# Altium footprint library MyPcbLib.PcbLib: 657 footprints (part 19 of 42)
Each footprint in its own frame and in the unit in brackets; x right, y up, seen from the top. Pads: shape width x height; smd on the part's side, far side on the other; paste and mask are expansions set on the pad; w line width, h text height; cw(c..) or ccw(c..) is an arc to the next point about the centre after c.
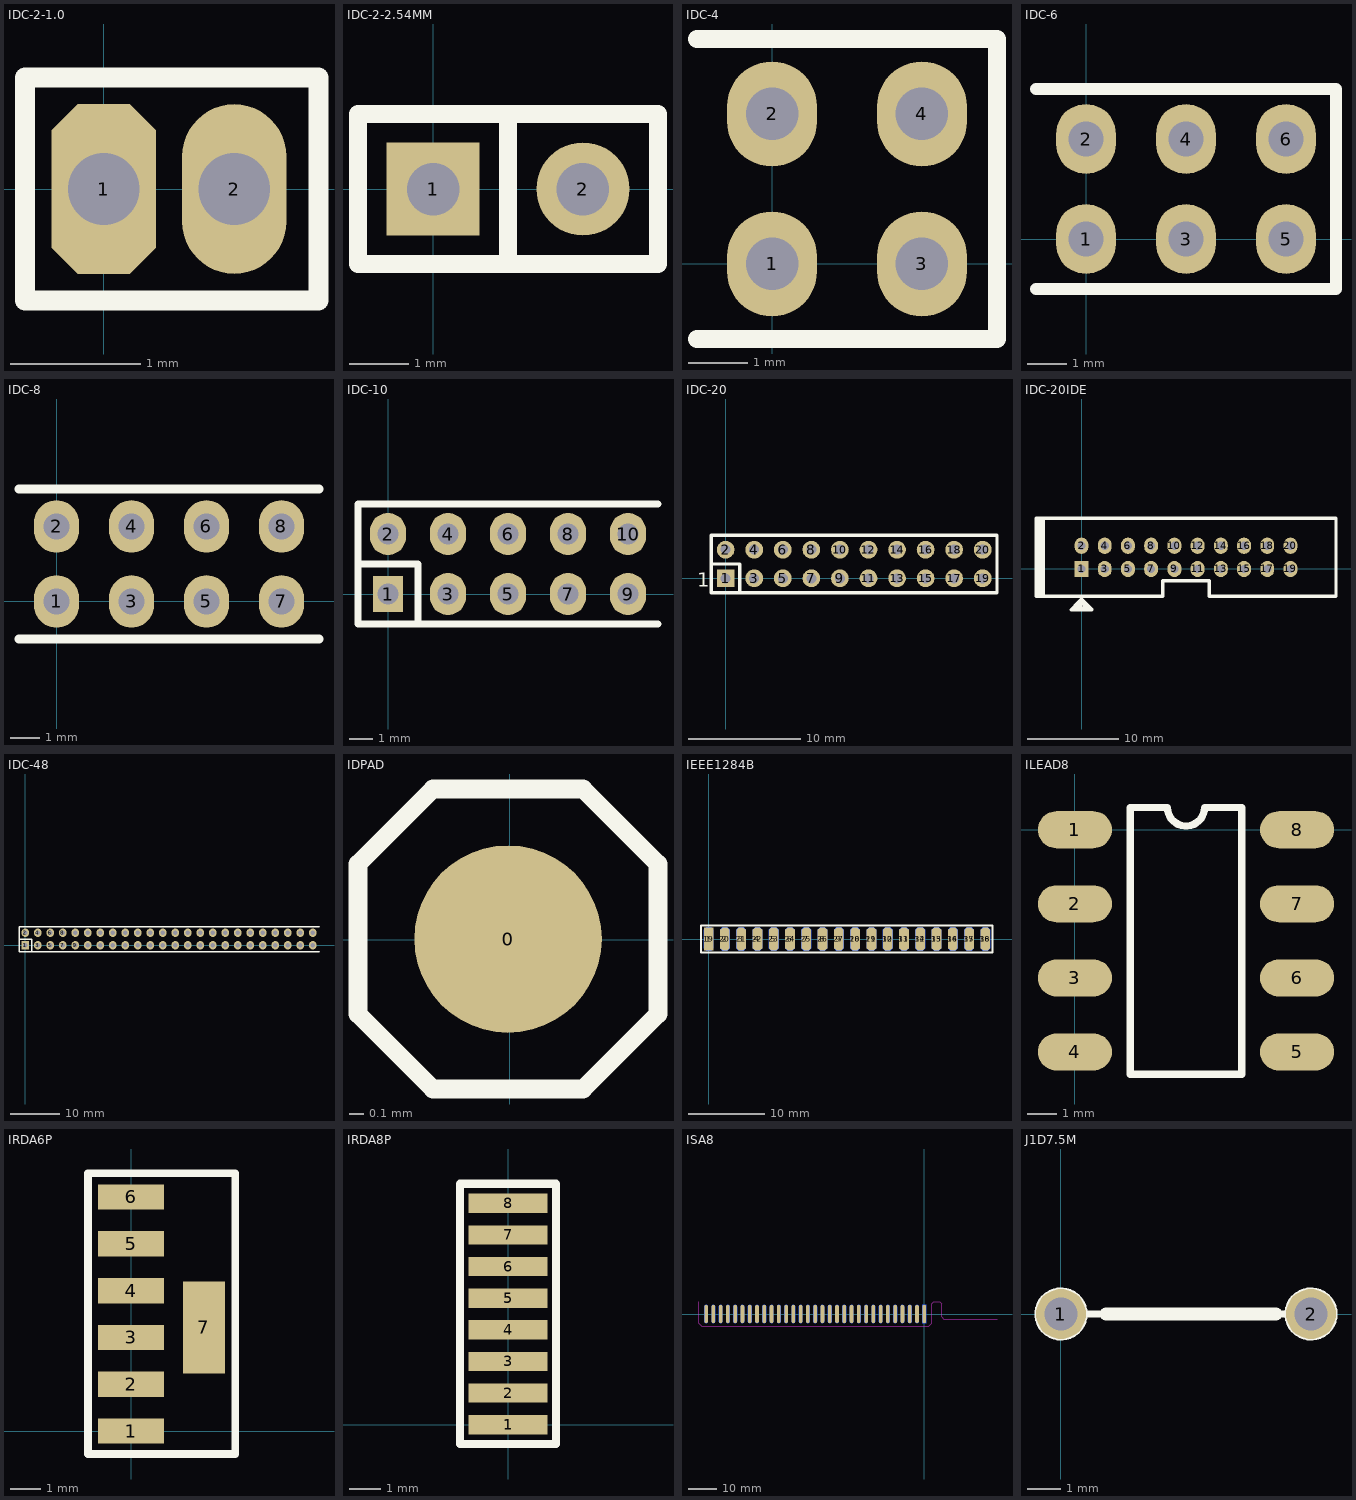
[diagram p18: the footprints below, top view; thin cyan lines are the x and y axes]

## IDC-2-1.0 [mm]
pads (2):
  oct 0.8x1.3 hole 0.55: 1(0,0)
  oval 0.8x1.3 hole 0.55: 2(1,0)
Top Overlay:
  lines w0.152: -0.603,-0.856 1.647,-0.856 1.647,0.856 -0.603,0.856 -0.603,-0.856

## IDC-2-2.54MM [mil]
pads (2):
  rect 62x62 hole 35: 1(0,0)
  round 62 hole 35: 2(100,0)
Top Overlay:
  lines w12: 50,-50 50,50 -50,50 ; -50,50 150,50 150,-50 -50,-50 -50,50

## IDC-4 [mil]
height 9.5
pads (4):
  oval 60x70 hole 35: 1(0,0) 2(0,100) 3(100,0) 4(100,100)
Top Overlay:
  lines w12: -50,-50 150,-50 150,150 -50,150

## IDC-6 [mil]
height 9.5
pads (6):
  oval 60x70 hole 35: 1(0,0) 2(0,100) 3(100,0) 4(100,100) 5(200,0) 6(200,100)
Top Overlay:
  lines w12: -50,-50 250,-50 250,150 -50,150

## IDC-8 [mil]
height 9.5
pads (8):
  oval 60x70 hole 35: 1(0,0) 2(0,100) 3(100,0) 4(100,100) 5(200,0) 6(200,100) 7(300,0) 8(300,100)
Top Overlay:
  lines w12: -50,-50 350,-50 ; -50,150 350,150

## IDC-10 [mil]
height 9.5
pads (10):
  rect 50x60 hole 35: 1(0,0)
  oval 60x70 hole 35: 2(0,100) 3(100,0) 4(100,100) 5(200,0) 6(200,100) 7(300,0) 8(300,100) 9(400,0) 10(400,100)
Top Overlay:
  lines w12: -50,50 50,50 50,-50 ; 450,-50 -50,-50 -50,150 450,150

## IDC-20 [mil]
pads (20):
  rect 62x62 hole 35: 1(0.5,-0.03)
  round 62 hole 35: 2(0.5,99.97) 3(100.5,-0.03) 4(100.5,99.97) 5(200.5,-0.03) 6(200.5,99.97) 7(300.5,-0.03) 8(300.5,99.97) 9(400.5,-0.03) 10(400.5,99.97) 11(500.5,-0.03) 12(500.5,99.97) 13(600.5,-0.03) 14(600.5,99.97) 15(700.5,-0.03) 16(700.5,99.97) 17(800.5,-0.03) 18(800.5,99.97) 19(900.5,-0.03) 20(900.5,99.97)
Top Overlay:
  lines w12: -49.5,49.97 50.5,49.97 50.5,-50.03 ; -49.5,-50.03 950.5,-50.03 950.5,149.97 -49.5,149.97 -49.5,-50.03
  text "1" at -99.89,-29.56 h50

## IDC-20IDE [mil]
pads (20):
  rect 60x70 hole 35: 1(0,0)
  oval 60x70 hole 35: 2(0,100) 3(100,0) 4(100,100) 5(200,0) 6(200,100) 7(300,0) 8(300,100) 9(400,0) 10(400,100) 11(500,0) 12(500,100) 13(600,0) 14(600,100) 15(700,0) 16(700,100) 17(800,0) 18(800,100) 19(900,0) 20(900,100)
Top Overlay:
  lines w8: 350,-118 350,-50 ; 550,-118 550,-50
  lines w15: -185,-118 -185,218 ; -175,-118 -175,218 ; -165,-118 -165,218 ; -34.24,-164.24 -30.76,-164.24 -20,-175 ; -27.15,-157.15 -22.85,-157.15 -5,-175 ; -16.42,-146.42 -16.42,-148.58 10,-175 ; -9.32,-139.32 -5.68,-139.32 30,-175 ; -196,-118 -196,218 1096,218 1096,-118 550,-118 550,-50 350,-50 350,-118 -196,-118 ; -45,-175 0,-130 45,-175 -45,-175

## IDC-48 [mil]
height 9.5
pads (48):
  rect 60x66 hole 35: 1(0,0)
  oval 60x66 hole 35: 2(0,100) 3(100,0) 4(100,100) 5(200,0) 6(200,100) 7(300,0) 8(300,100) 9(400,0) 10(400,100) 11(500,0) 12(500,100) 13(600,0) 14(600,100) 15(700,0) 16(700,100) 17(800,0) 18(800,100) 19(900,0) 20(900,100) 21(1000,0) 22(1000,100) 23(1100,0) 24(1100,100) 25(1200,0) 26(1200,100) 27(1300,0) 28(1300,100) 29(1400,0) 30(1400,100) 31(1500,0) 32(1500,100) 33(1600,0) 34(1600,100) 35(1700,0) 36(1700,100) 37(1800,0) 38(1800,100) 39(1900,0) 40(1900,100) 41(2000,0) 42(2000,100) 43(2100,0) 44(2100,100) 45(2200,0) 46(2200,100) 47(2300,0) 48(2300,100)
Top Overlay:
  lines w12: -50,50 50,50 50,-50 ; 2350,-50 -50,-50 -50,150 2350,150

## IDPAD [mm]
pads (1):
  round 1.27 smd: 0(-0.01,0.005)
Top Overlay:
  lines w0.127: -1.026,-0.503 -1.026,0.513 -0.518,1.021 0.498,1.021 1.006,0.513 1.006,-0.503 0.498,-1.011 -0.518,-1.011 -1.026,-0.503

## IEEE1284B [mil]
pads (36):
  rect 50x120 smd: 1(0,0)
  oct 50x120 smd: 2(84.25,0) 3(168.5,0) 4(252.76,0) 5(337.01,0) 6(421.26,0) 7(505.51,0) 8(589.76,0) 9(674.02,0) 10(758.27,0) 11(842.52,0) 12(926.77,0) 13(1011.02,0) 14(1095.28,0) 15(1179.53,0) 16(1263.78,0) 17(1348.03,0) 18(1432.28,0)
  oct 50x120 smd far side: 19(0,0) 20(84.25,0) 21(168.5,0) 22(252.76,0) 23(337.01,0) 24(421.26,0) 25(505.51,0) 26(589.76,0) 27(674.02,0) 28(758.27,0) 29(842.52,0) 30(926.77,0) 31(1011.02,0) 32(1095.28,0) 33(1179.53,0) 34(1263.78,0) 35(1348.03,0) 36(1432.28,0)
Top Overlay:
  lines w10: -40,-70 1470,-70 1470,70 -40,70 -40,-70

## ILEAD8 [mm]
pads (8):
  oval 2.54x1.27 smd: 1(0,0) 2(0,-2.54) 3(0,-5.08) 4(0,-7.62) 5(7.62,-7.62) 6(7.62,-5.08) 7(7.62,-2.54) 8(7.62,0)
Top Overlay:
  lines w0.254: 1.905,-8.382 1.905,0.762 3.175,0.762 ccw(c3.81,0.762) 4.445,0.762 5.715,0.762 5.715,-8.382 1.905,-8.382

## IRDA6P [mil]
pads (7):
  rect 86x33 smd: 1(0,0) 2(0,60.91) 3(0,121.93) 4(0,182.95) 5(0,243.98) 6(0,305)
  rect 55x120 smd: 7(95,135)
Top Overlay:
  lines w10: -56,-30 136,-30 136,336 -56,336 -56,-30

## IRDA8P [mil]
pads (8):
  rect 98x24 smd: 1(0,0) 2(0,39.37) 3(0,78.74) 4(0,118.11) 5(0,157.48) 6(0,196.85) 7(0,236.22) 8(0,275.59)
Top Overlay:
  lines w10: -60,-24 60,-24 60,300 -60,300 -60,-24

## ISA8 [mm]
pads (62):
  rect 1.27x6.35 smd far side: 1(0,0)
  oval 1.27x6.35 smd far side: 2(-2.54,0) 3(-5.08,0) 4(-7.62,0) 5(-10.16,0) 6(-12.7,0) 7(-15.24,0) 8(-17.78,0) 9(-20.32,0) 10(-22.86,0) 11(-25.4,0) 12(-27.94,0) 13(-30.48,0) 14(-33.02,0) 15(-35.56,0) 16(-38.1,0) 17(-40.64,0) 18(-43.18,0) 19(-45.72,0) 20(-48.26,0) 21(-50.8,0) 22(-53.34,0) 23(-55.88,0) 24(-58.42,0) 25(-60.96,0) 26(-63.5,0) 27(-66.04,0) 28(-68.58,0) 29(-71.12,0) 30(-73.66,0) 31(-76.2,0)
  oval 1.27x6.35 smd: 32(-76.2,0) 33(-73.66,0) 34(-71.12,0) 35(-68.58,0) 36(-66.04,0) 37(-63.5,0) 38(-60.96,0) 39(-58.42,0) 40(-55.88,0) 41(-53.34,0) 42(-50.8,0) 43(-48.26,0) 44(-45.72,0) 45(-43.18,0) 46(-40.64,0) 47(-38.1,0) 48(-35.56,0) 49(-33.02,0) 50(-30.48,0) 51(-27.94,0) 52(-25.4,0) 53(-22.86,0) 54(-20.32,0) 55(-17.78,0) 56(-15.24,0) 57(-12.7,0) 58(-10.16,0) 59(-7.62,0) 60(-5.08,0) 61(-2.54,0) 62(0,0)
Top Solder:
  rectangle: -78.74,-4.318 2.54,3.302
Bottom Solder:
  rectangle: -78.74,-4.318 2.54,3.302
Keep-Out Layer:
  lines w0.254: -78.74,4.318 -78.74,-3.302 -77.724,-4.318 1.524,-4.318 2.54,-3.302 2.54,3.556 3.302,4.318 5.334,4.318 6.096,3.556 6.096,-1.016 6.858,-1.778 25.4,-1.778

## J1D7.5M [mm]
pads (2):
  round 1.5 / inner round 1.5 / far side round 2.2 hole 1: 1(0,0)
  round 1.5 / inner round 1.5 / far side oval 1.5x2.2 hole 1: 2(7.5,0)
Top Overlay:
  circle w0.2: c7.5,0 r0.7
  circle w0.2: c0,0 r0.7
  lines w0.2: 0,0 7.5,0
  lines w0.4: 1.35,0 6.45,0